# Altium footprint library XC Driver Board.PcbLib: 29 footprints (part 2 of 2)
Each footprint in its own frame and in the unit in brackets; x right, y up, seen from the top. Pads: shape width x height; smd on the part's side, far side on the other; paste and mask are expansions set on the pad; w line width, h text height; cw(c..) or ccw(c..) is an arc to the next point about the centre after c.
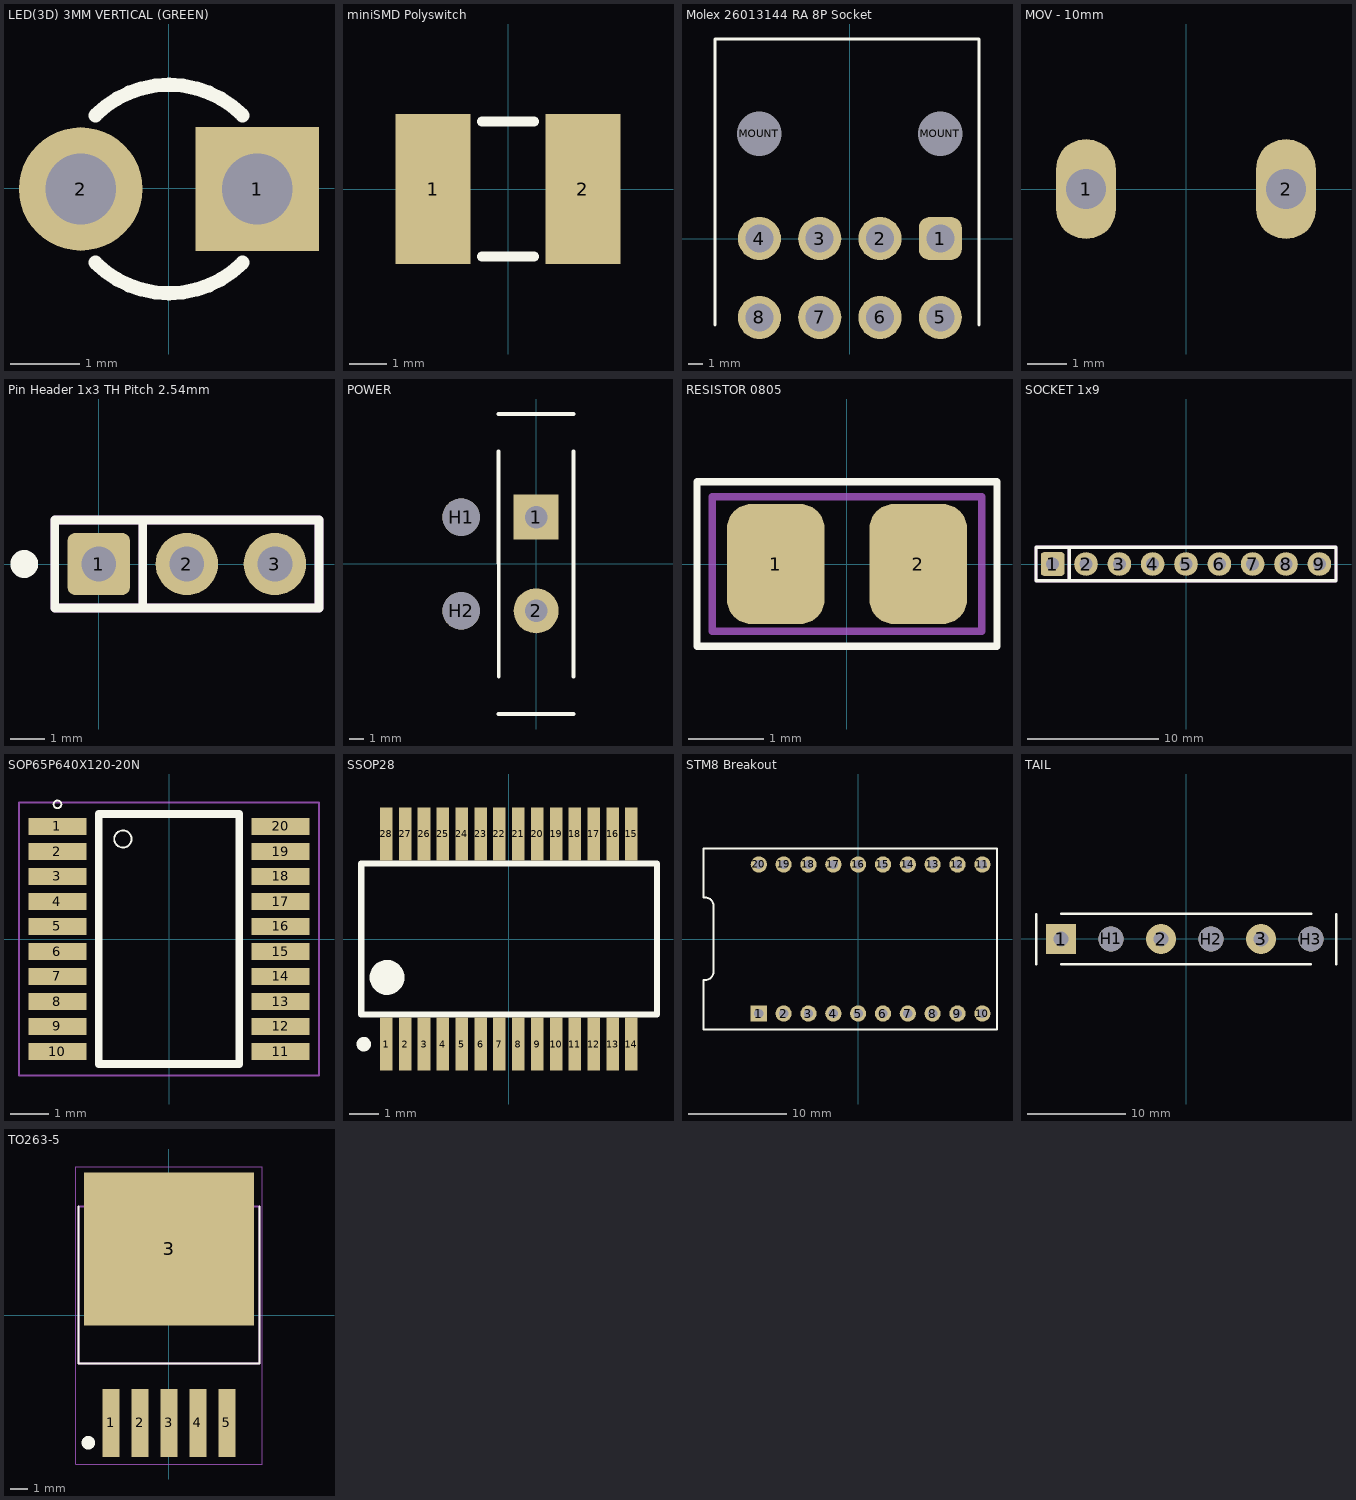
[diagram p1: the footprints below, top view; thin cyan lines are the x and y axes]

## LED(3D) 3MM VERTICAL (GREEN) [mil]
pads (2):
  rect 70x70 hole 40: 1(50.06,-0.28)
  round 70 hole 40: 2(-49.94,-0.28)
Top Overlay:
  lines w8: -41.7,-42.04 ccw(c0.06,-0.28) 41.82,-42.04 ; -41.7,41.47 cw(c0.06,-0.28) 41.82,41.47
3D body "User Library-LED_d3-GRN.STEP": height 195.87, standoff -98.43, extent -65.45,-65.41 61.06,64.5

## miniSMD Polyswitch [mm] "RAYCHEM - MINISMDC050F-2"
pads (2):
  rect 2x4 smd: 1(-2,0) 2(2,0)
Top Overlay:
  lines w0.254: -0.7,-1.8 0.7,-1.8 ; -0.7,1.8 0.7,1.8
3D body: height 0.62, standoff 0, extent 2,-1.7 2.4,1.7
3D body: height 0.62, standoff 0, extent 0,-1.7 2,1.7
3D body: height 0.62, standoff 0, extent -2,-1.7 0,1.7
3D body: height 0.62, standoff 0, extent -2.4,-1.7 -2,1.7

## Molex 26013144 RA 8P Socket [mm] "Molex 26013144 RA 8P Socket"
pads (10):
  rrect50% 3x3 hole 1.95: 1(6.3,0)
  round 3 hole 1.95: 2(2.1,0) 3(-2.1,0) 4(-6.3,0) 5(6.3,-5.5) 6(2.1,-5.5) 7(-2.1,-5.5) 8(-6.3,-5.5)
  round 3 hole 3.1 unplated: MOUNT(-6.3,7.3) MOUNT(6.3,7.3)
Top Overlay:
  lines w0.2: -9.4,-6.035 -9.4,13.9 9,13.9 9,-6.035
3D body "Molex 26013144 RA 8P Socket.step": height 11.41, standoff -3.59, extent -9.4,-6.035 9,13.9

## MOV - 10mm [mil]
pads (2):
  oval 60x100 hole 40: 1(-100,0) 2(100,0)
3D body "Disk Varistor D7,5mm P5mm W4,5mm.stp": height 426.23, standoff -122.98, extent -164.37,-121.64 164.4,121.63

## Pin Header 1x3 TH Pitch 2.54mm [mm] "PinHeader 1x3 TH Pitch 2.54mm"
height 9.5
pads (3):
  rrect25% 1.8x1.8 hole 1: 1(0,0)
  round 1.8 hole 1: 2(2.54,0) 3(5.08,0)
Top Overlay:
  circle w0.5: c-2.15,0 r0.15
  lines w0.254: 1.27,-1.27 1.27,1.27 -1.27,1.27 ; -1.27,1.27 -1.27,-1.27 6.35,-1.27 6.35,1.27 -1.27,1.27
Mechanical 3:
  lines w0.254: 1.27,-1.27 1.27,1.27 -1.27,1.27 ; -1.27,1.27 -1.27,-1.27 6.35,-1.27 6.35,1.27 -1.27,1.27
3D body "Pin Header 1x3 TH Pitch 2.54mm.stp": height 9.5, standoff -3.2, extent -1.27,-1.27 6.35,1.27

## POWER [mil] "Connector; Header; 3 Position"
height 78.74
pads (4):
  rect 120x120 hole 60: 1(0,125)
  round 120 hole 60: 2(0,-125)
  round 100 hole 100: H1(-200,125) H2(-200,-125)
Top Overlay:
  lines w10: -100,-400 100,-400 ; -100,-300 -100,300 ; -100,400 100,400 ; 100,-300 100,300

## RESISTOR 0805 [mm]
height 1.7
pads (2):
  rrect50% 1.3x1.6 smd: 1(-0.95,0) 2(0.95,0)
Top Overlay:
  lines w0.1: -2,-1.1 2,-1.1 2,1.1 -2,1.1 -2,-1.1
Mechanical 15:
  lines w0.1: -1.8,-0.9 -1.8,0.9 1.8,0.9 1.8,-0.9 -1.8,-0.9
3D body "User Library-0805(2012M) Res.step": height 0.8, standoff 0.01, extent -1.254,-0.622 1.254,0.622

## SOCKET 1x9 [mm]
pads (9):
  rrect25% 1.8x1.8 hole 1: 1(-10.16,0)
  round 1.8 hole 1: 2(-7.62,0) 3(-5.08,0) 4(-2.54,0) 5(0,0) 6(2.54,0) 7(5.08,0) 8(7.62,0) 9(10.16,0)
Top Overlay:
  lines w0.254: -8.89,-1.27 -8.89,1.27 -11.43,1.27 ; -11.43,1.27 -11.43,-1.27 11.43,-1.27 11.43,1.27 -11.43,1.27
Mechanical 3:
  lines w0.254: -8.89,-1.27 -8.89,1.27 -11.43,1.27 ; -11.43,1.27 -11.43,-1.27 11.43,-1.27 11.43,1.27 -11.43,1.27
3D body "socket-1x9.step": height 6.74, standoff -3.16, extent -11.43,-1.778 11.43,1.778

## SOP65P640X120-20N [mm]
pads (20):
  rect 1.5x0.45 smd: 1(-2.9,2.925) 2(-2.9,2.275) 3(-2.9,1.625) 4(-2.9,0.975) 5(-2.9,0.325) 6(-2.9,-0.325) 7(-2.9,-0.975) 8(-2.9,-1.625) 9(-2.9,-2.275) 10(-2.9,-2.925) 11(2.9,-2.925) 12(2.9,-2.275) 13(2.9,-1.625) 14(2.9,-0.975) 15(2.9,-0.325) 16(2.9,0.325) 17(2.9,0.975) 18(2.9,1.625) 19(2.9,2.275) 20(2.9,2.925)
Top Overlay:
  circle w0.05: c-2.9,3.5 r0.1
  circle w0.05: c-1.2,2.6 r0.224
  circle w0.05: c-1.2,2.6 r0.224
  lines w0.2: -1.825,-3.25 -1.825,3.25 1.825,3.25 1.825,-3.25 -1.825,-3.25
Mechanical 15:
  lines w0.05: -3.9,-3.55 -3.9,3.55 3.9,3.55 3.9,-3.55 -3.9,-3.55
3D body "TSSOP-20.stp": height 1.11, standoff 0.01, extent -3.215,-3.2 3.216,3.2

## SSOP28 [mil]
pads (28):
  rect 17x72 smd: 1(-166.34,-142.72) 2(-140.75,-142.72) 3(-115.16,-142.72) 4(-89.57,-142.72) 5(-63.98,-142.72) 6(-38.39,-142.72) 7(-12.79,-142.72) 8(12.8,-142.72) 9(38.38,-142.72) 10(63.97,-142.72) 11(89.56,-142.72) 12(115.15,-142.72) 13(140.74,-142.72) 14(166.33,-142.72) 15(166.33,142.72) 16(140.74,142.72) 17(115.15,142.72) 18(89.56,142.72) 19(63.97,142.72) 20(38.38,142.72) 21(12.8,142.72) 22(-12.79,142.72) 23(-38.39,142.72) 24(-63.98,142.72) 25(-89.57,142.72) 26(-115.16,142.72) 27(-140.75,142.72) 28(-166.34,142.72)
Top Overlay:
  circle w23.62: c-165.35,-52.17 r11.81
  circle w9.84: c-196.85,-142.72 r4.92
  rectangle: -204.72,-102.36 -200,102.36
  lines w8: -200.79,-102.36 200.78,-102.36 200.78,102.36 -200.79,102.36 ; -200,-102.36 -200,102.36
3D body "User Library-SSOP-28-1.step": height 84.65, standoff 0, extent -203.35,-152.67 203.35,152.68

## STM8 Breakout [mil] "STM8S103F3P6 Dev board"
pads (20):
  rect 65x65 hole 38: 1(-400,-300)
  round 65 hole 38: 2(-300,-300) 3(-200,-300) 4(-100,-300) 5(0,-300) 6(100,-300) 7(200,-300) 8(300,-300) 9(400,-300) 10(500,-300) 11(500,300) 12(400,300) 13(300,300) 14(200,300) 15(100,300) 16(0,300) 17(-100,300) 18(-200,300) 19(-300,300) 20(-400,300)
Top Overlay:
  lines w7.87: -618.9,167.32 -622.04,167.32 ; -622.04,-364.17 ccw(c-622.04,-364.17) -622.04,-364.17 ; -622.04,-364.17 559.06,-364.17 559.06,364.18 ; -622.04,-364.17 -622.04,-165.45 ; -622.04,-165.45 ccw(c-622.04,-165.45) -622.04,-165.45 ; -622.04,-165.45 ccw(c-622.04,-165.45) -622.04,-165.45 ; -622.04,-165.45 -615.75,-165.45 ccw(c-615.75,-132.37) -582.68,-132.37 -582.68,134.24 ccw(c-615.75,134.24) -615.75,167.32 -622.04,167.32 ; -622.04,167.32 -622.04,364.16 ; -622.04,364.16 ccw(c-622.04,364.17) -622.04,364.18 ; -622.04,364.17 -622.04,364.18 ; -622.04,364.18 559.06,364.18 ; 559.06,364.18 559.06,364.18
3D body "STM8S103F3P6 Dev board.STEP": height 496.56, standoff -239.66, extent -622.04,-364.17 559.06,364.18

## TAIL [mil] "Connector; Header; 3 Position"
height 78.74
pads (6):
  rect 120x120 hole 60: 1(-500,0)
  round 120 hole 60: 2(-100,0) 3(300,0)
  round 100 hole 100: H1(-300,0) H2(100,0) H3(500,0)
Top Overlay:
  lines w10: -600,-100 -600,100 ; -500,-100 500,-100 ; -500,100 500,100 ; 600,-100 600,100

## TO263-5 [mm] "TO263-5"
pads (6):
  rect 1x4 smd: 1(-3.4,-6.33) 2(-1.7,-6.33) 3(0,-6.33) 4(1.7,-6.33) 5(3.4,-6.33)
  rect 10x9 smd: 3(0,3.91)
Top Overlay:
  circle w0.4: c-4.75,-7.5 r0.2
  lines w0.127: -5.33,6.4 -5.33,-2.84 5.33,-2.84 5.33,6.4
Mechanical 13:
  lines w0.127: -5.33,-2.84 -5.33,6.4 5.33,6.4 5.33,-2.84 -5.33,-2.84
Mechanical 15:
  lines w0.05: -5.5,-8.75 5.5,-8.75 5.5,8.75 -5.5,8.75 -5.5,-8.75
3D body "TO263-5-1.stp": height 4.22, standoff 0, extent -4.911,-7.275 4.911,7.327